# Altium footprint library FTP.PcbLib: 70 footprints (part 5 of 5)
Each footprint in its own frame and in the unit in brackets; x right, y up, seen from the top. Pads: shape width x height; smd on the part's side, far side on the other; paste and mask are expansions set on the pad; w line width, h text height; cw(c..) or ccw(c..) is an arc to the next point about the centre after c.
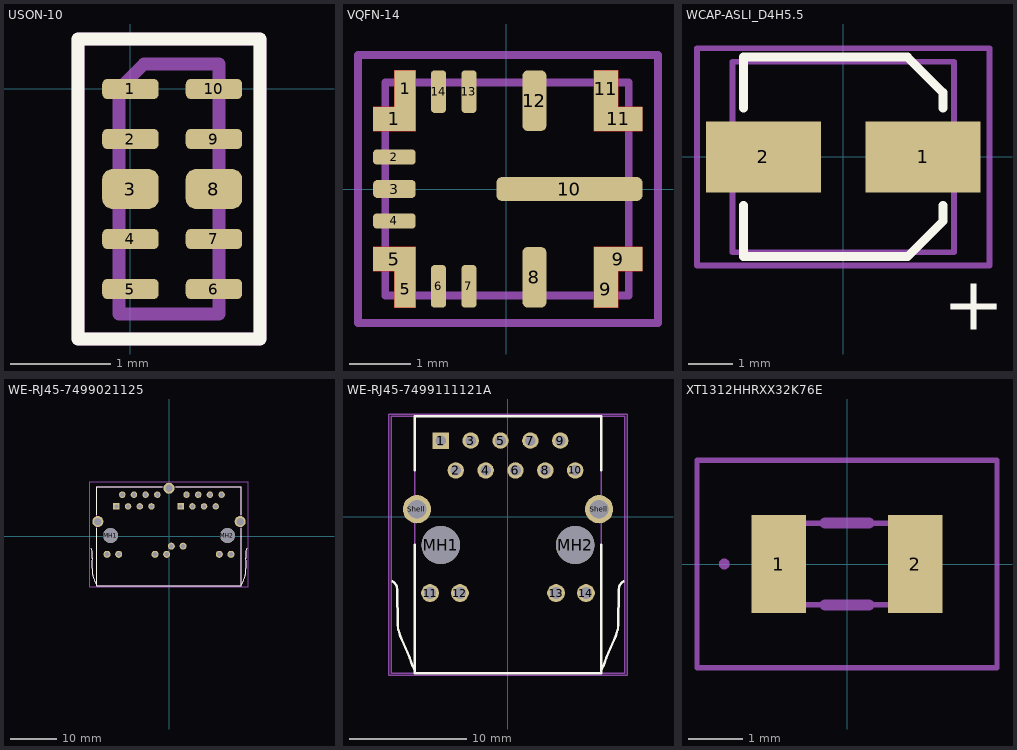
[diagram p4: the footprints below, top view; thin cyan lines are the x and y axes]

## USON-10 [mm]
pads (10):
  rrect50% 0.565x0.2 smd mask+0.07: 1(0,0) 2(0,-0.5) 4(0,-1.5) 5(0,-2) 6(0.835,-2) 7(0.835,-1.5) 9(0.835,-0.5) 10(0.835,0)
  rrect50% 0.565x0.4 smd mask+0.07: 3(0,-1) 8(0.835,-1)
Top Overlay:
  lines w0.127: -0.525,-2.5 -0.525,0.5 1.295,0.5 1.295,-2.5 -0.525,-2.5
  text "." at -1.1,-0.1 h0.5
Mechanical 13:
  lines w0.127: -0.115,-2.25 0.885,-2.25 0.885,0.25 0.135,0.25 -0.115,0 -0.115,-2.25
Mechanical 15:
  lines w0.127: -0.525,-2.5 -0.525,0.5 1.295,0.5 1.295,-2.5 -0.525,-2.5
3D body "User Library-UDFN10.STEP": height 0.54, standoff -0.01, extent -0.079,-2.263 0.931,0.237

## VQFN-14 [mm]
pads (18):
  rect 0.7x0.4 smd paste-403.566 mask-403.566: 1(-1.837,1.15) 5(-1.837,-1.15)
  rect 0.35x0.6 smd paste-403.566 mask-403.566: 1(-1.662,1.65) 5(-1.662,-1.65)
  rrect50% 0.7x0.25 smd mask+0.07: 2(-1.837,0.525) 4(-1.837,-0.525)
  rrect50% 0.7x0.3 smd mask+0.07: 3(-1.837,0)
  rrect50% 0.25x0.7 smd mask+0.07: 6(-1.112,-1.6) 7(-0.612,-1.6) 13(-0.612,1.6) 14(-1.112,1.6)
  rrect50% 0.4x1 smd mask+0.07: 8(0.463,-1.45) 12(0.463,1.45)
  rect 0.4x0.6 smd paste-403.566 mask-403.566: 9(1.638,-1.65) 11(1.638,1.65)
  rect 0.8x0.4 smd paste-403.566 mask-403.566: 9(1.838,-1.15) 11(1.838,1.15)
  rrect50% 2.4x0.4 smd mask+0.07: 10(1.038,0)
Top Layer:
  region: -1.488,-1.951 -1.838,-1.951 -1.839,-1.351 -2.187,-1.351 -2.188,-0.951 -1.488,-0.951
  region: 1.436,-1.951 1.835,-1.951 1.836,-1.95 1.836,-1.351 2.235,-1.351 2.236,-1.351 2.236,-0.951 1.436,-0.951
  region: 1.436,1.951 1.835,1.951 1.836,1.95 1.836,1.351 2.235,1.351 2.236,1.351 2.236,0.951 1.436,0.951
  region: -1.488,1.951 -1.838,1.951 -1.839,1.351 -2.187,1.351 -2.188,0.951 -1.488,0.951
Top Overlay:
  text "." at -3.36,1.427 h0.76
Mechanical 13:
  lines w0.127: -1.987,-1.75 -1.987,1.75 2.012,1.75 2.012,-1.75 -1.987,-1.75
Mechanical 15:
  lines w0.127: -2.436,-2.2 -2.436,2.2 2.492,2.2 2.492,-2.2 -2.436,-2.2
  text "+" at -0.501,-0.752 h1.5
3D body "LM62435CPPQRJRRQ1.stp": height 1.1, standoff 0, extent -1.987,-1.75 2.012,1.75

## WCAP-ASLI_D4H5.5 [mm]
height 5.5
pads (2):
  rect 2.6x1.6 smd: 1(1.8,0) 2(-1.8,0)
Top Overlay:
  lines w0.2: -2.25,-1.1 -2.25,-2.25 1.45,-2.25 2.25,-1.45 2.25,-1.1 ; -2.25,1.1 -2.25,2.25 1.45,2.25 2.25,1.45 2.25,1.1
  text "+" at 2.25,-3.9 h1.22
Mechanical 13:
  lines w0.127: -2.5,-2.15 -2.5,2.15 2.5,2.15 2.5,-2.15 -2.5,-2.15
Mechanical 15:
  lines w0.127: -3.3,-2.45 3.3,-2.45 3.3,2.45 -3.3,2.45 -3.3,-2.45
  text "+" at -0.508,-0.751 h1.5
3D body "4x5.5x1.stp": height 5.5, standoff 0, extent -2.5,-2.15 2.5,2.15

## WE-RJ45-7499021125 [mm]
height 15.21
pads (29):
  rect 1.4x1.4 hole 0.89: A1(-11.43,6.5) B1(2.54,6.5)
  round 1.4 hole 0.89: A2(-10.16,9.04) A3(-8.89,6.5) A4(-7.62,9.04) A5(-6.35,6.5) A6(-5.08,9.04) A7(-3.81,6.5) A8(-2.54,9.04) B2(3.81,9.04) B3(5.08,6.5) B4(6.35,9.04) B5(7.62,6.5) B6(8.89,9.04) B7(10.16,6.5) B8(11.43,9.04)
  round 1.52 hole 1.02: A9(-13.47,-3.91) A10(-10.93,-3.91) A11(-3.05,-3.91) A12(-0.51,-3.91) B9(0.51,-2.14) B10(3.05,-2.14) B11(10.93,-3.91) B12(13.47,-3.91)
  round 3.25 hole 3.25 unplated: MH1(-12.7,0.15) MH2(12.7,0.15)
  round 2.4 hole 1.63: Shell(-15.465,3.2) Shell(0,10.44) Shell(15.465,3.2)
Top Overlay:
  lines w0.2: -16.862,-2.641 cw(c-17.973,-3.253) -16.706,-3.31 -16.713,-4.722 ccw(c-13.098,-5.162) -16.74,-5.192 ccw(c7.924,-6.02) -16.669,-8.064 ccw(c-8.25,-6.545) -15.7,-10.75 ; -15.7,1.7 -15.7,-10.75 ; -15.7,4.7 -15.7,10.75 -1.45,10.75 ; 1.45,10.75 15.7,10.75 15.7,4.7 ; 15.7,1.7 15.7,-10.75 ; 16.862,-2.641 ccw(c17.973,-3.253) 16.706,-3.31 16.713,-4.722 cw(c13.098,-5.162) 16.74,-5.192 cw(c-7.924,-6.02) 16.669,-8.064 cw(c8.25,-6.545) 15.7,-10.75 ; -15.7,-10.75 15.7,-10.75
Mechanical 11:
  text "+" at -0.507,-0.754 h1.5
Mechanical 13:
  lines w0.1: -16.862,-2.641 cw(c-17.973,-3.253) -16.706,-3.31 -16.713,-4.722 ccw(c-13.098,-5.162) -16.74,-5.192 ccw(c7.924,-6.02) -16.669,-8.064 ccw(c-8.25,-6.545) -15.7,-10.75 ; 16.862,-2.641 ccw(c17.973,-3.253) 16.706,-3.31 16.713,-4.722 cw(c13.098,-5.162) 16.74,-5.192 cw(c-7.924,-6.02) 16.669,-8.064 cw(c8.25,-6.545) 15.7,-10.75 ; -15.7,-10.75 -15.7,10.75 15.7,10.75 15.7,-10.75 ; -15.7,-10.75 15.7,-10.75
Mechanical 15:
  lines w0.127: -17.2,-10.95 -17.2,11.84 17.2,11.84 17.2,-10.95 -17.2,-10.95
3D body "7499021125.stp": height 14.81, standoff -3.66, extent -16.923,-10.75 16.923,10.75

## WE-RJ45-7499111121A [mm]
pads (18):
  rect 1.4x1.4 hole 0.9: 1(-5.715,6.485)
  round 1.4 hole 0.9: 2(-4.445,3.945) 3(-3.175,6.485) 4(-1.905,3.945) 5(-0.635,6.485) 6(0.635,3.945) 7(1.905,6.485) 8(3.175,3.945) 9(4.445,6.485) 10(5.715,3.945)
  round 1.52 hole 1.02: 11(-6.63,-6.485) 12(-4.09,-6.485) 13(4.09,-6.485) 14(6.63,-6.485)
  round 3.25 hole 3.25 unplated: MH1(-5.715,-2.405) MH2(5.715,-2.405)
  round 2.4 hole 1.6: Shell(-7.745,0.645) Shell(7.745,0.645)
Top Overlay:
  lines w0.2: -9.83,-5.484 cw(c-10.225,-6.175) -9.428,-6.175 -9.37,-9.275 ccw(c-8.1,-9.275) -9.27,-9.769 ccw(c-6.8,-9.275) -9.012,-10.48 -8.345,-12.039 ccw(c-2,-10.155) -7.94,-13.075 ; -7.94,-2.375 -7.94,-13.295 7.94,-13.295 7.94,-2.375 ; -7.94,3.945 -7.94,8.545 7.94,8.545 7.94,3.945 ; 7.94,-13.075 ccw(c2,-10.155) 8.345,-12.039 9.012,-10.48 ccw(c6.8,-9.275) 9.27,-9.769 ccw(c8.1,-9.275) 9.37,-9.275 9.428,-6.175 cw(c10.225,-6.175) 9.83,-5.484
  text "." at -5.9,9.525 h0.76
Mechanical 13:
  lines w0.127: -9.923,-13.295 -9.923,8.545 9.923,8.545 9.923,-13.295 -9.923,-13.295 ; -9.923,-13.295 -9.923,-13.295
Mechanical 15:
  lines w0.127: -9.83,-5.484 cw(c-10.225,-6.175) -9.428,-6.175 -9.37,-9.275 ccw(c-8.1,-9.275) -9.27,-9.769 ccw(c-6.8,-9.275) -9.012,-10.48 -8.345,-12.039 ccw(c-2,-10.155) -7.94,-13.075 ; 7.94,-13.075 ccw(c2,-10.155) 8.345,-12.039 9.012,-10.48 ccw(c6.8,-9.275) 9.27,-9.769 ccw(c8.1,-9.275) 9.37,-9.275 9.428,-6.175 cw(c10.225,-6.175) 9.83,-5.484 ; -10.13,-13.495 -10.13,8.745 10.13,8.745 10.13,-13.495 -10.13,-13.495 ; -7.94,-13.295 7.94,-13.295 7.94,8.545 -7.94,8.545 -7.94,-13.295
  text "+" at -0.5,-0.8 h1.5
3D body "7499111121A.stp": height 16.01, standoff -3.57, extent -9.923,-13.295 9.923,8.545

## XT1312HHRXX32K76E [mm]
pads (2):
  rect 1x1.8 smd: 1(-1.25,0) 2(1.25,0)
Top Assembly:
  lines w0.1: -2.75,-1.9 2.75,-1.9 2.75,1.9 -2.75,1.9 -2.75,-1.9 ; -1.6,-0.75 1.6,-0.75 1.6,0.75 -1.6,0.75 -1.6,-0.75
Mechanical 7:
  lines w0.1: -2.3,0 cw(c-2.25,0) -2.2,0 cw(c-2.25,0) -2.3,0
  lines w0.2: -0.4,-0.75 0.4,-0.75 ; -0.4,0.75 0.4,0.75
3D body "XT1312HHRXX32K76E.stp": height 0.81, standoff 0, extent -1.6,-0.75 1.6,0.75